# Altium footprint library 常用元件封装库.PcbLib: 1310 footprints (part 41 of 83)
Each footprint in its own frame and in the unit in brackets; x right, y up, seen from the top. Pads: shape width x height; smd on the part's side, far side on the other; paste and mask are expansions set on the pad; w line width, h text height; cw(c..) or ccw(c..) is an arc to the next point about the centre after c.
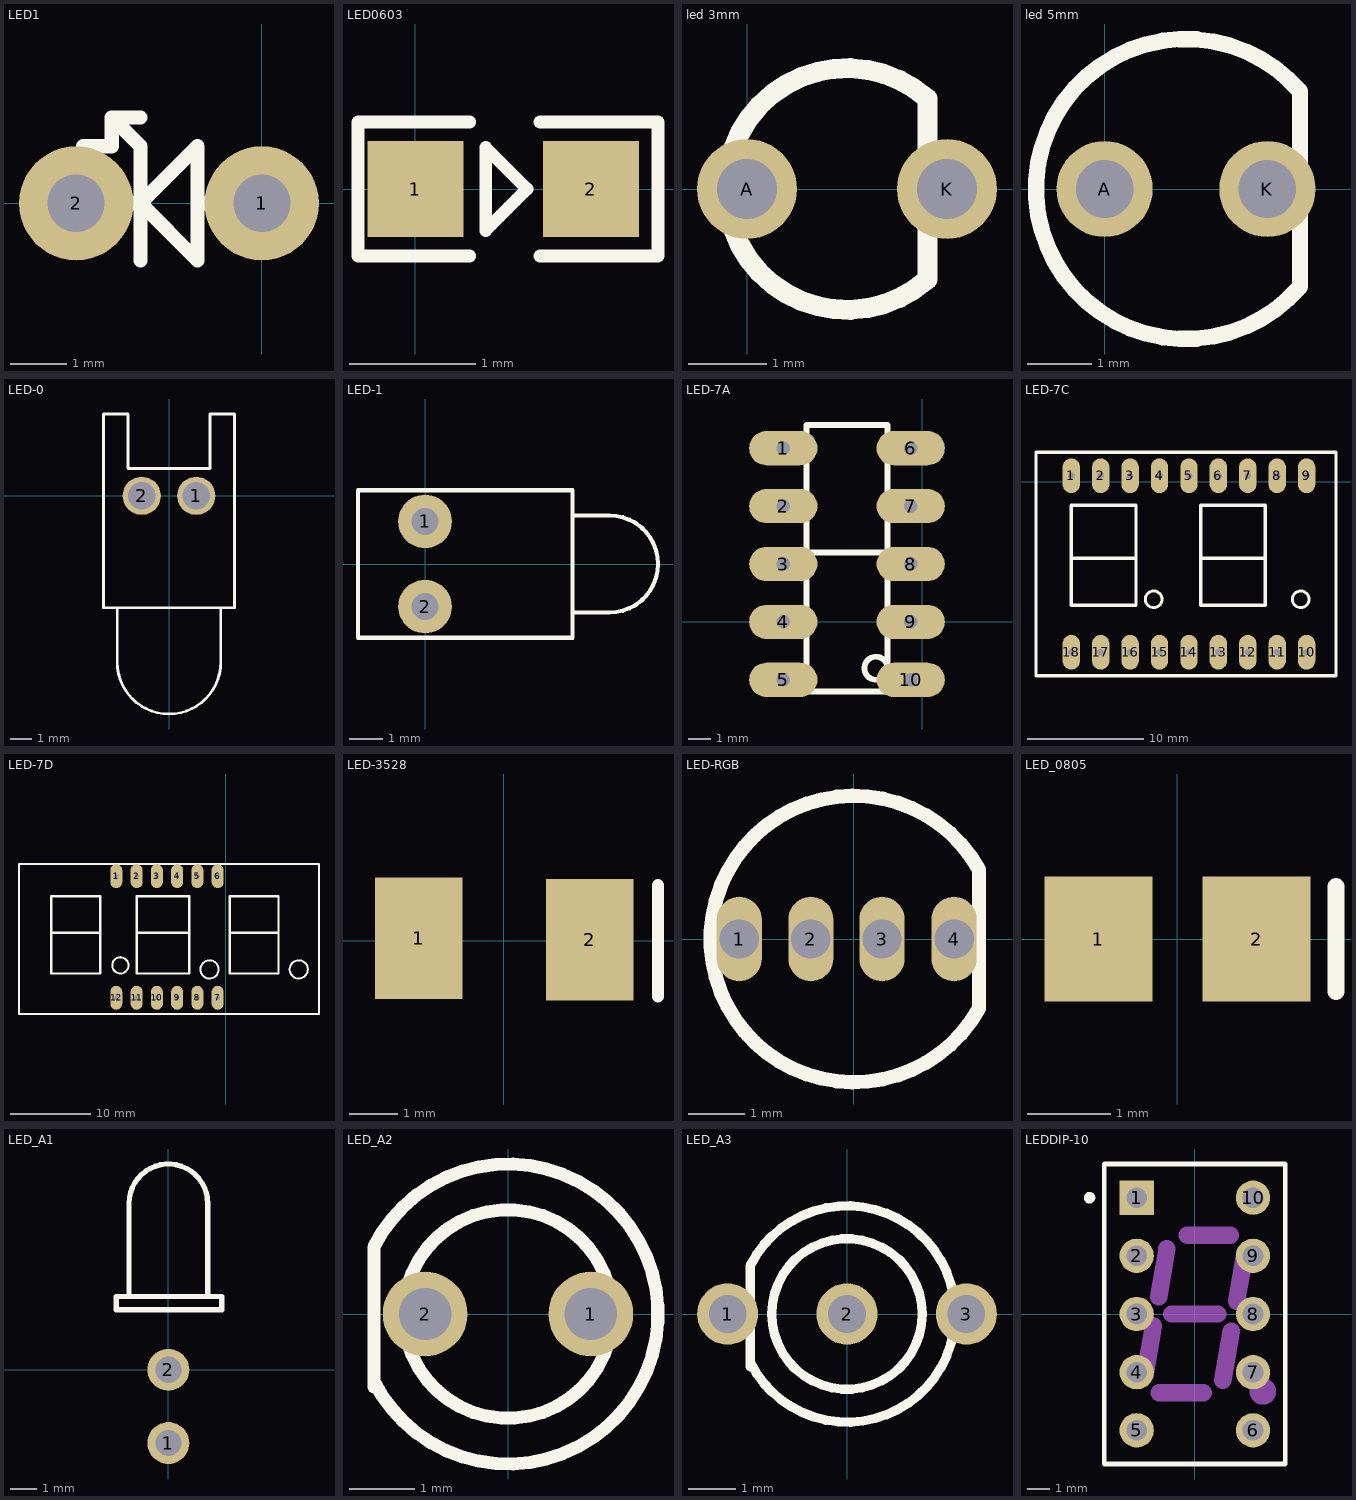
[diagram p40: the footprints below, top view; thin cyan lines are the x and y axes]

## LED1 [mil]
pads (2):
  round 80 hole 40: 1(0,0) 2(-130,0)
Top Overlay:
  lines w10: -130,0 -90,0 ; -125,20 -125,40 ; -105,20 -125,40 ; -85,-40 -85,40 -105,60 ; -85,60 -105,60 ; -40,0 0,0 ; -125,40 -105,40 -105,60 ; -85,0 -45,40 -45,20 -45,-40 -85,0

## LED0603 [mil]
pads (2):
  rect 30x30 smd: 1(0,0) 2(55,0)
Top Overlay:
  lines w4: 17,-21 -18,-21 -18,21 17,21 ; 39,-21 76,-21 76,21 39,21 ; 22,-13 35,0 22,13 22,-13
3D body "User Library-led_0603LED0603 red.STEP": height 23.62, standoff 0, extent -4.32,-15.74 59.46,15.75

## led 3mm [mil]
pads (2):
  round 50 hole 30: A(0,0) K(100,0)
Top Overlay:
  lines w10: 90.14,-45.15 cw(c50,0) 90.14,45.15 90.14,-45.15

## led 5mm [mm]
pads (2):
  round 1.5 hole 0.9: A(0,0) K(2.54,0)
Top Overlay:
  lines w0.254: 3.048,-1.524 cw(c1.27,0) 3.048,1.524 3.048,-1.524

## LED-0 [mil] "Typical INFRARED GaAs LED; 2 Leads"
pads (2):
  round 70 hole 50: 1(50,0) 2(-50,0)
Top Overlay:
  lines w5: -95,-205 -95,-305 ccw(c0,-305) 95,-305 95,-205 ; -120,-205 120,-205 120,150 75,150 75,50 -75,50 -75,150 -120,150 -120,-205

## LED-1 [mm] "Typical RED GaAs LED; 2 Leads"
pads (2):
  round 1.6 hole 0.8: 1(0,1.27) 2(0,-1.27)
Top Overlay:
  lines w0.127: 4.4,-1.45 5.5,-1.45 ccw(c5.5,0) 5.5,1.45 4.4,1.45 ; -2,-2.2 4.4,-2.2 4.4,2.2 -2,2.2 -2,-2.2

## LED-7A [mm]
pads (10):
  oval 3x1.5 hole 0.6: 1(-6.096,7.62) 2(-6.096,5.08) 3(-6.096,2.54) 4(-6.096,0) 5(-6.096,-2.54) 6(-0.508,7.62) 7(-0.508,5.08) 8(-0.508,2.54) 9(-0.508,0) 10(-0.508,-2.54)
Top Overlay:
  circle w0.254: c-2.032,-2.032 r0.508
  lines w0.254: -5.08,3.048 -1.524,3.048 ; -5.08,-3.048 -5.08,8.636 -1.524,8.636 -1.524,-3.048 -5.08,-3.048

## LED-7C [mm]
pads (18):
  oval 1.5x3 hole 0.6: 1(6.604,0.508) 2(9.144,0.508) 3(11.684,0.508) 4(14.224,0.508) 5(16.764,0.508) 6(19.304,0.508) 7(21.844,0.508) 8(24.384,0.508) 9(26.924,0.508) 10(26.924,-14.732) 11(24.384,-14.732) 12(21.844,-14.732) 13(19.304,-14.732) 14(16.764,-14.732) 15(14.224,-14.732) 16(11.684,-14.732) 17(9.144,-14.732) 18(6.604,-14.732)
Top Overlay:
  circle w0.254: c13.716,-10.16 r0.718
  circle w0.254: c26.416,-10.16 r0.718
  lines w0.3: 4.064,2.54 29.464,2.54 29.464,-16.764 3.556,-16.764 3.556,2.54 4.572,2.54 ; 6.604,-6.604 12.192,-6.604 ; 17.78,-6.604 23.368,-6.604 ; 6.604,-10.668 12.192,-10.668 12.192,-2.032 6.604,-2.032 6.604,-10.668 ; 17.78,-10.668 23.368,-10.668 23.368,-2.032 17.78,-2.032 17.78,-10.668

## LED-7D [mm]
pads (12):
  oval 1.5x3 hole 0.6: 1(-13.716,30.48) 2(-11.176,30.48) 3(-8.636,30.48) 4(-6.096,30.48) 5(-3.556,30.48) 6(-1.016,30.48) 7(-1.016,15.24) 8(-3.556,15.24) 9(-6.096,15.24) 10(-8.636,15.24) 11(-11.176,15.24) 12(-13.716,15.24)
Top Overlay:
  circle w0.254: c9.144,18.796 r1.136
  circle w0.254: c-2.032,18.796 r1.136
  circle w0.254: c-13.208,19.304 r1.016
  lines w0.3: -21.844,23.368 -15.748,23.368 ; -11.176,23.368 -4.572,23.368 ; 0.508,23.368 6.604,23.368 ; -25.908,13.208 11.684,13.208 11.684,32.004 11.176,32.004 -25.908,32.004 -25.908,13.208 ; -21.844,18.288 -21.336,18.288 -15.748,18.288 -15.748,27.94 -21.844,27.94 -21.844,18.288 ; -11.176,18.288 -11.176,27.94 -4.572,27.94 -4.572,18.288 -11.176,18.288 ; 0.508,18.288 0.508,27.94 6.604,27.94 6.604,18.288 0.508,18.288

## LED-3528 [mm] "贴片二极管"
height 3
pads (2):
  rect 1.8x2.5 smd: 1(-1.753,0.052) 2(1.772,0.027)
Top Overlay:
  lines w0.254: 3.175,-1.143 3.175,1.143

## LED-RGB [mm] "三基色二极管"
height 6
pads (4):
  oval 0.8x1.5 hole 0.7: 1(-2.032,0) 2(-0.762,0) 3(0.5,0) 4(1.778,0)
Top Overlay:
  lines w0.254: 2.22,-1.234 cw(c0,0) 2.22,1.234 2.22,-1.234

## LED_0805 [mm] "贴片二极管"
height 1.1
pads (2):
  rect 1.3x1.5 smd: 1(-0.95,0) 2(0.95,0)
Top Overlay:
  lines w0.2: 1.905,-0.635 1.905,0.635

## LED_A1 [mm] "直径3MM二极管"
height 3.5
pads (2):
  round 1.6 hole 1: 1(0,-2.794) 2(0,0)
Top Overlay:
  lines w0.2: -1.5,2.852 -1.5,6.35 cw(c0,6.35) 1.5,6.35 1.5,2.852 ; -1.984,2.286 -1.984,2.794 2.032,2.794 2.032,2.286 -1.984,2.286

## LED_A2 [mm] "直径3MM二极管"
height 5.5
pads (2):
  round 1.3 hole 0.8: 1(1.27,0) 2(-1.27,0)
Top Overlay:
  circle w0.2: c0,0 r1.6
  lines w0.2: -2.057,-1.118 -2.057,1.029 cw(c0,0) -2.057,-1.029

## LED_A3 [mm] "直径3MM二极管"
height 5.5
pads (3):
  round 1.3 hole 0.8: 1(-2.54,0) 2(0,0) 3(2.54,0)
Top Overlay:
  circle w0.2: c0,0 r1.6
  lines w0.2: -2.057,-1.118 -2.057,1.029 cw(c0,0) -2.057,-1.029

## LEDDIP-10 [mm] "LED, 7-Segment Display, 7.62 mm, RHD; 10 Leads; Row Space 5.08 mm; Pitch 2.54 mm"
height 6.34
pads (10):
  rect 1.5x1.5 hole 0.9: 1(-2.54,5.08)
  round 1.5 hole 0.9: 2(-2.54,2.54) 3(-2.54,0) 4(-2.54,-2.54) 5(-2.54,-5.08) 6(2.54,-5.08) 7(2.54,-2.54) 8(2.54,0) 9(2.54,2.54) 10(2.54,5.08)
Top Overlay:
  circle w0.25: c-4.6,5.08 r0.125
  lines w0.2: -3.95,-6.55 -3.95,6.55 3.95,6.55 3.95,-6.55 -3.95,-6.55
Mechanical 1:
  circle w0.86: c2.97,-3.38 r0.15
  lines w0.762: -2.19,-2.69 -1.81,-0.52 ; -1.58,0.76 -1.22,2.84 ; -1.56,-3.43 0.36,-3.43 ; -1.004,0 1.004,0 ; -0.34,3.43 1.55,3.43 ; 1.22,-2.89 1.59,-0.76 ; 1.82,0.56 2.2,2.69